# Altium footprint library ICs And Semiconductors SMD_BGA.PcbLib: 118 footprints (part 7 of 17)
Each footprint in its own frame and in the unit in brackets; x right, y up, seen from the top. Pads: shape width x height; smd on the part's side, far side on the other; paste and mask are expansions set on the pad; w line width, h text height; cw(c..) or ccw(c..) is an arc to the next point about the centre after c.
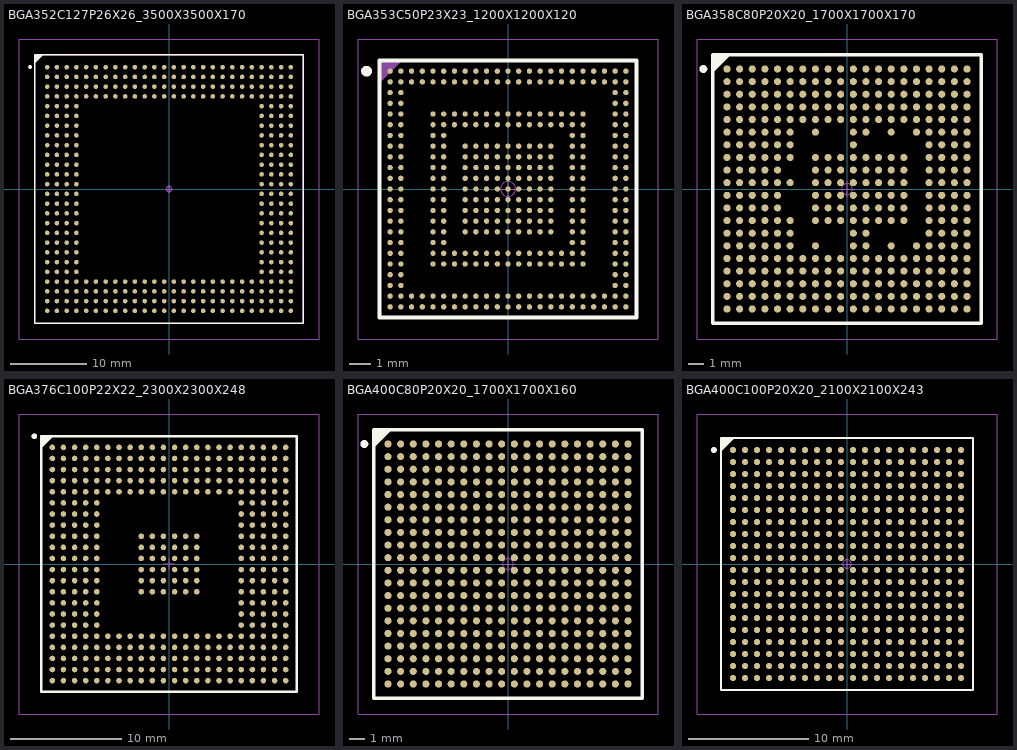
[diagram p6: the footprints below, top view; thin cyan lines are the x and y axes]

## BGA352C127P26X26_3500X3500X170 [mm] "BGA, 1.27mm Pitch, Square; 352 Pin, 26 Columns X 26 Rows, 35.00mm X 35.00mm X 1.70mm H"
height 1.7
pads (352):
  round 0.6 smd: A1(-15.875,15.875) A2(-14.605,15.875) A3(-13.335,15.875) A4(-12.065,15.875) A5(-10.795,15.875) A6(-9.525,15.875) A7(-8.255,15.875) A8(-6.985,15.875) A9(-5.715,15.875) A10(-4.445,15.875) A11(-3.175,15.875) A12(-1.905,15.875) A13(-0.635,15.875) A14(0.635,15.875) A15(1.905,15.875) A16(3.175,15.875) A17(4.445,15.875) A18(5.715,15.875) A19(6.985,15.875) A20(8.255,15.875) A21(9.525,15.875) A22(10.795,15.875) A23(12.065,15.875) A24(13.335,15.875) A25(14.605,15.875) A26(15.875,15.875) AA1(-15.875,-9.525) AA2(-14.605,-9.525) AA3(-13.335,-9.525) AA4(-12.065,-9.525) AA23(12.065,-9.525) AA24(13.335,-9.525) AA25(14.605,-9.525) AA26(15.875,-9.525) AB1(-15.875,-10.795) AB2(-14.605,-10.795) AB3(-13.335,-10.795) AB4(-12.065,-10.795) AB23(12.065,-10.795) AB24(13.335,-10.795) AB25(14.605,-10.795) AB26(15.875,-10.795) AC1(-15.875,-12.065) AC2(-14.605,-12.065) AC3(-13.335,-12.065) AC4(-12.065,-12.065) AC5(-10.795,-12.065) AC6(-9.525,-12.065) AC7(-8.255,-12.065) AC8(-6.985,-12.065) AC9(-5.715,-12.065) AC10(-4.445,-12.065) AC11(-3.175,-12.065) AC12(-1.905,-12.065) AC13(-0.635,-12.065) AC14(0.635,-12.065) AC15(1.905,-12.065) AC16(3.175,-12.065) AC17(4.445,-12.065) AC18(5.715,-12.065) AC19(6.985,-12.065) AC20(8.255,-12.065) AC21(9.525,-12.065) AC22(10.795,-12.065) AC23(12.065,-12.065) AC24(13.335,-12.065) AC25(14.605,-12.065) AC26(15.875,-12.065) AD1(-15.875,-13.335) AD2(-14.605,-13.335) AD3(-13.335,-13.335) AD4(-12.065,-13.335) AD5(-10.795,-13.335) AD6(-9.525,-13.335) AD7(-8.255,-13.335) AD8(-6.985,-13.335) AD9(-5.715,-13.335) AD10(-4.445,-13.335) AD11(-3.175,-13.335) AD12(-1.905,-13.335) AD13(-0.635,-13.335) AD14(0.635,-13.335) AD15(1.905,-13.335) AD16(3.175,-13.335) AD17(4.445,-13.335) AD18(5.715,-13.335) AD19(6.985,-13.335) AD20(8.255,-13.335) AD21(9.525,-13.335) AD22(10.795,-13.335) AD23(12.065,-13.335) AD24(13.335,-13.335) AD25(14.605,-13.335) AD26(15.875,-13.335) AE1(-15.875,-14.605) AE2(-14.605,-14.605) AE3(-13.335,-14.605) AE4(-12.065,-14.605) AE5(-10.795,-14.605) AE6(-9.525,-14.605) AE7(-8.255,-14.605) AE8(-6.985,-14.605) AE9(-5.715,-14.605) AE10(-4.445,-14.605) AE11(-3.175,-14.605) AE12(-1.905,-14.605) AE13(-0.635,-14.605) AE14(0.635,-14.605) AE15(1.905,-14.605) AE16(3.175,-14.605) AE17(4.445,-14.605) AE18(5.715,-14.605) AE19(6.985,-14.605) AE20(8.255,-14.605) AE21(9.525,-14.605) AE22(10.795,-14.605) AE23(12.065,-14.605) AE24(13.335,-14.605) AE25(14.605,-14.605) AE26(15.875,-14.605) AF1(-15.875,-15.875) AF2(-14.605,-15.875) AF3(-13.335,-15.875) AF4(-12.065,-15.875) AF5(-10.795,-15.875) AF6(-9.525,-15.875) AF7(-8.255,-15.875) AF8(-6.985,-15.875) AF9(-5.715,-15.875) AF10(-4.445,-15.875) AF11(-3.175,-15.875) AF12(-1.905,-15.875) AF13(-0.635,-15.875) AF14(0.635,-15.875) AF15(1.905,-15.875) AF16(3.175,-15.875) AF17(4.445,-15.875) AF18(5.715,-15.875) AF19(6.985,-15.875) AF20(8.255,-15.875) AF21(9.525,-15.875) AF22(10.795,-15.875) AF23(12.065,-15.875) AF24(13.335,-15.875) AF25(14.605,-15.875) AF26(15.875,-15.875) B1(-15.875,14.605) B2(-14.605,14.605) B3(-13.335,14.605) B4(-12.065,14.605) B5(-10.795,14.605) B6(-9.525,14.605) B7(-8.255,14.605) B8(-6.985,14.605) B9(-5.715,14.605) B10(-4.445,14.605) B11(-3.175,14.605) B12(-1.905,14.605) B13(-0.635,14.605) B14(0.635,14.605) B15(1.905,14.605) B16(3.175,14.605) B17(4.445,14.605) B18(5.715,14.605) B19(6.985,14.605) B20(8.255,14.605) B21(9.525,14.605) B22(10.795,14.605) B23(12.065,14.605) B24(13.335,14.605) B25(14.605,14.605) B26(15.875,14.605) C1(-15.875,13.335) C2(-14.605,13.335) C3(-13.335,13.335) C4(-12.065,13.335) C5(-10.795,13.335) C6(-9.525,13.335) C7(-8.255,13.335) C8(-6.985,13.335) C9(-5.715,13.335) C10(-4.445,13.335) C11(-3.175,13.335) C12(-1.905,13.335) C13(-0.635,13.335) C14(0.635,13.335) C15(1.905,13.335) C16(3.175,13.335) C17(4.445,13.335) C18(5.715,13.335) C19(6.985,13.335) C20(8.255,13.335) C21(9.525,13.335) C22(10.795,13.335) C23(12.065,13.335) C24(13.335,13.335) C25(14.605,13.335) C26(15.875,13.335) D1(-15.875,12.065) D2(-14.605,12.065) D3(-13.335,12.065) D4(-12.065,12.065) D5(-10.795,12.065) D6(-9.525,12.065) D7(-8.255,12.065) D8(-6.985,12.065) D9(-5.715,12.065) D10(-4.445,12.065) D11(-3.175,12.065) D12(-1.905,12.065) D13(-0.635,12.065) D14(0.635,12.065) D15(1.905,12.065) D16(3.175,12.065) D17(4.445,12.065) D18(5.715,12.065) D19(6.985,12.065) D20(8.255,12.065) D21(9.525,12.065) D22(10.795,12.065) D23(12.065,12.065) D24(13.335,12.065) D25(14.605,12.065) D26(15.875,12.065) E1(-15.875,10.795) E2(-14.605,10.795) E3(-13.335,10.795) E4(-12.065,10.795) E23(12.065,10.795) E24(13.335,10.795) E25(14.605,10.795) E26(15.875,10.795) F1(-15.875,9.525) F2(-14.605,9.525) F3(-13.335,9.525) F4(-12.065,9.525) F23(12.065,9.525) F24(13.335,9.525) F25(14.605,9.525) F26(15.875,9.525) G1(-15.875,8.255) G2(-14.605,8.255) G3(-13.335,8.255) G4(-12.065,8.255) G23(12.065,8.255) G24(13.335,8.255) G25(14.605,8.255) G26(15.875,8.255) H1(-15.875,6.985) H2(-14.605,6.985) H3(-13.335,6.985) H4(-12.065,6.985) H23(12.065,6.985) H24(13.335,6.985) H25(14.605,6.985) H26(15.875,6.985) J1(-15.875,5.715) J2(-14.605,5.715) J3(-13.335,5.715) J4(-12.065,5.715) J23(12.065,5.715) J24(13.335,5.715) J25(14.605,5.715) J26(15.875,5.715) K1(-15.875,4.445) K2(-14.605,4.445) K3(-13.335,4.445) K4(-12.065,4.445) K23(12.065,4.445) K24(13.335,4.445) K25(14.605,4.445) K26(15.875,4.445) L1(-15.875,3.175) L2(-14.605,3.175) L3(-13.335,3.175) L4(-12.065,3.175) L23(12.065,3.175) L24(13.335,3.175) L25(14.605,3.175) L26(15.875,3.175) M1(-15.875,1.905) M2(-14.605,1.905) M3(-13.335,1.905) M4(-12.065,1.905) M23(12.065,1.905) M24(13.335,1.905) M25(14.605,1.905) M26(15.875,1.905) N1(-15.875,0.635) N2(-14.605,0.635) N3(-13.335,0.635) N4(-12.065,0.635) N23(12.065,0.635) N24(13.335,0.635) N25(14.605,0.635) N26(15.875,0.635) P1(-15.875,-0.635) P2(-14.605,-0.635) P3(-13.335,-0.635) P4(-12.065,-0.635) P23(12.065,-0.635) P24(13.335,-0.635) P25(14.605,-0.635) P26(15.875,-0.635) R1(-15.875,-1.905) R2(-14.605,-1.905) R3(-13.335,-1.905) R4(-12.065,-1.905) R23(12.065,-1.905) R24(13.335,-1.905) R25(14.605,-1.905) R26(15.875,-1.905) T1(-15.875,-3.175) T2(-14.605,-3.175) T3(-13.335,-3.175) T4(-12.065,-3.175) T23(12.065,-3.175) T24(13.335,-3.175) T25(14.605,-3.175) T26(15.875,-3.175) U1(-15.875,-4.445) U2(-14.605,-4.445) U3(-13.335,-4.445) U4(-12.065,-4.445) U23(12.065,-4.445) U24(13.335,-4.445) U25(14.605,-4.445) U26(15.875,-4.445) V1(-15.875,-5.715) V2(-14.605,-5.715) V3(-13.335,-5.715) V4(-12.065,-5.715) V23(12.065,-5.715) V24(13.335,-5.715) V25(14.605,-5.715) V26(15.875,-5.715) W1(-15.875,-6.985) W2(-14.605,-6.985) W3(-13.335,-6.985) W4(-12.065,-6.985) W23(12.065,-6.985) W24(13.335,-6.985) W25(14.605,-6.985) W26(15.875,-6.985) Y1(-15.875,-8.255) Y2(-14.605,-8.255) Y3(-13.335,-8.255) Y4(-12.065,-8.255) Y23(12.065,-8.255) Y24(13.335,-8.255) Y25(14.605,-8.255) Y26(15.875,-8.255)
Top Overlay:
  circle w0.25: c-18.1,15.9 r0.125
  lines w0.2: -17.5,16.5 -16.5,17.5 ; -17.5,16.7 -16.7,17.5 ; -17.5,16.9 -16.9,17.5 ; -17.5,17.1 -17.1,17.5 ; -17.5,17.3 -17.3,17.5 ; -17.5,-17.5 17.5,-17.5 17.5,17.5 -17.5,17.5 -17.5,-17.5
Mechanical 14:
  lines w0.1: -17.5,16.5 -16.5,17.5 ; -17.5,16.6 -16.6,17.5 ; -17.5,16.7 -16.7,17.5 ; -17.5,16.8 -16.8,17.5 ; -17.5,16.9 -16.9,17.5 ; -17.5,17 -17,17.5 ; -17.5,17.1 -17.1,17.5 ; -17.5,17.2 -17.2,17.5 ; -17.5,17.3 -17.3,17.5 ; -17.5,17.4 -17.4,17.5 ; -17.5,-17.5 17.5,-17.5 17.5,17.5 -17.5,17.5 -17.5,-17.5
  text "AF" at -18.95,-16.125 h0.6
  text "AE" at -18.95,-14.855 h0.6
  text "AD" at -18.95,-13.585 h0.6
  text "AC" at -18.95,-12.315 h0.6
  text "AB" at -18.95,-11.045 h0.6
  text "AA" at -18.95,-9.775 h0.6
  text "Y" at -18.325,-8.505 h0.6
  text "W" at -18.325,-7.235 h0.6
  text "V" at -18.325,-5.965 h0.6
  text "U" at -18.325,-4.695 h0.6
  text "T" at -18.325,-3.425 h0.6
  text "R" at -18.325,-2.155 h0.6
  text "P" at -18.325,-0.885 h0.6
  text "N" at -18.325,0.385 h0.6
  text "M" at -18.325,1.655 h0.6
  text "L" at -18.325,2.925 h0.6
  text "K" at -18.325,4.195 h0.6
  text "J" at -18.325,5.465 h0.6
  text "H" at -18.325,6.735 h0.6
  text "G" at -18.325,8.005 h0.6
  text "F" at -18.325,9.275 h0.6
  text "E" at -18.325,10.545 h0.6
  text "D" at -18.325,11.815 h0.6
  text "C" at -18.325,13.085 h0.6
  text "B" at -18.325,14.355 h0.6
  text "A" at -18.325,15.625 h0.6
  text "26" at 16.05,17.925 h0.6
  text "25" at 14.825,17.925 h0.6
  text "24" at 13.5,17.925 h0.6
  text "23" at 12.275,17.925 h0.6
  text "16" at 3.5,17.9 h0.6
  text "15" at 2.175,17.875 h0.6
  text "14" at 0.85,17.875 h0.6
  text "13" at -0.375,17.875 h0.6
  text "12" at -1.675,17.875 h0.6
  text "11" at -2.975,17.875 h0.6
  text "10" at -4.2,17.875 h0.6
  text "9" at -5.425,17.875 h0.6
  text "8" at -6.7,17.875 h0.6
  text "1" at -15.65,17.925 h0.6
  text "18" at 5.975,17.9 h0.6
  text "19" at 7.275,17.9 h0.6
  text "20" at 8.525,17.9 h0.6
  text "21" at 9.775,18.025 h0.6
  text "22" at 11.025,17.925 h0.6
  text "17" at 4.725,17.9 h0.6
  text "7" at -7.97,17.875 h0.6
  text "6" at -9.24,17.875 h0.6
  text "5" at -10.51,17.875 h0.6
  text "4" at -11.78,17.875 h0.6
  text "3" at -13.05,17.875 h0.6
  text "2" at -14.32,17.875 h0.6
Mechanical 15:
  circle w0.05: c0,0 r0.35
  lines w0.05: -0.5,0 0.5,0 ; 0,-0.5 0,0.5 ; -19.55,-19.55 19.55,-19.55 19.55,19.55 -19.55,19.55 -19.55,-19.55
3D body "BGA352C127P26X26_3500X3500X170.stp": height 1.7, standoff 0, extent -17.5,-17.5 17.5,17.5

## BGA353C50P23X23_1200X1200X120 [mm] "BGA, 0.50mm Pitch, Square; 353 Pin,23 Columns X 23 Rows, 12.00mm X 12.00mm X 1.20mm H"
height 1.2
pads (353):
  round 0.25 smd: A1(-5.5,5.5) A2(-5,5.5) A3(-4.5,5.5) A4(-4,5.5) A5(-3.5,5.5) A6(-3,5.5) A7(-2.5,5.5) A8(-2,5.5) A9(-1.5,5.5) A10(-1,5.5) A11(-0.5,5.5) A12(0,5.5) A13(0.5,5.5) A14(1,5.5) A15(1.5,5.5) A16(2,5.5) A17(2.5,5.5) A18(3,5.5) A19(3.5,5.5) A20(4,5.5) A21(4.5,5.5) A22(5,5.5) A23(5.5,5.5) AA1(-5.5,-4.5) AA2(-5,-4.5) AA22(5,-4.5) AA23(5.5,-4.5) AB1(-5.5,-5) AB2(-5,-5) AB3(-4.5,-5) AB4(-4,-5) AB5(-3.5,-5) AB6(-3,-5) AB7(-2.5,-5) AB8(-2,-5) AB9(-1.5,-5) AB10(-1,-5) AB11(-0.5,-5) AB12(0,-5) AB13(0.5,-5) AB14(1,-5) AB15(1.5,-5) AB16(2,-5) AB17(2.5,-5) AB18(3,-5) AB19(3.5,-5) AB20(4,-5) AB21(4.5,-5) AB22(5,-5) AB23(5.5,-5) AC1(-5.5,-5.5) AC2(-5,-5.5) AC3(-4.5,-5.5) AC4(-4,-5.5) AC5(-3.5,-5.5) AC6(-3,-5.5) AC7(-2.5,-5.5) AC8(-2,-5.5) AC9(-1.5,-5.5) AC10(-1,-5.5) AC11(-0.5,-5.5) AC12(0,-5.5) AC13(0.5,-5.5) AC14(1,-5.5) AC15(1.5,-5.5) AC16(2,-5.5) AC17(2.5,-5.5) AC18(3,-5.5) AC19(3.5,-5.5) AC20(4,-5.5) AC21(4.5,-5.5) AC22(5,-5.5) AC23(5.5,-5.5) B1(-5.5,5) B2(-5,5) B3(-4.5,5) B4(-4,5) B5(-3.5,5) B6(-3,5) B7(-2.5,5) B8(-2,5) B9(-1.5,5) B10(-1,5) B11(-0.5,5) B12(0,5) B13(0.5,5) B14(1,5) B15(1.5,5) B16(2,5) B17(2.5,5) B18(3,5) B19(3.5,5) B20(4,5) B21(4.5,5) B22(5,5) B23(5.5,5) C1(-5.5,4.5) C2(-5,4.5) C22(5,4.5) C23(5.5,4.5) D1(-5.5,4) D2(-5,4) D22(5,4) D23(5.5,4) E1(-5.5,3.5) E2(-5,3.5) E5(-3.5,3.5) E6(-3,3.5) E7(-2.5,3.5) E8(-2,3.5) E9(-1.5,3.5) E10(-1,3.5) E11(-0.5,3.5) E12(0,3.5) E13(0.5,3.5) E14(1,3.5) E15(1.5,3.5) E16(2,3.5) E17(2.5,3.5) E18(3,3.5) E19(3.5,3.5) E22(5,3.5) E23(5.5,3.5) F1(-5.5,3) F2(-5,3) F5(-3.5,3) F6(-3,3) F7(-2.5,3) F8(-2,3) F9(-1.5,3) F10(-1,3) F11(-0.5,3) F12(0,3) F13(0.5,3) F14(1,3) F15(1.5,3) F16(2,3) F17(2.5,3) F18(3,3) F19(3.5,3) F22(5,3) F23(5.5,3) G1(-5.5,2.5) G2(-5,2.5) G5(-3.5,2.5) G6(-3,2.5) G18(3,2.5) G19(3.5,2.5) G22(5,2.5) G23(5.5,2.5) H1(-5.5,2) H2(-5,2) H5(-3.5,2) H6(-3,2) H8(-2,2) H9(-1.5,2) H10(-1,2) H11(-0.5,2) H12(0,2) H13(0.5,2) H14(1,2) H15(1.5,2) H16(2,2) H18(3,2) H19(3.5,2) H22(5,2) H23(5.5,2) J1(-5.5,1.5) J2(-5,1.5) J5(-3.5,1.5) J6(-3,1.5) J8(-2,1.5) J9(-1.5,1.5) J10(-1,1.5) J11(-0.5,1.5) J12(0,1.5) J13(0.5,1.5) J14(1,1.5) J15(1.5,1.5) J16(2,1.5) J18(3,1.5) J19(3.5,1.5) J22(5,1.5) J23(5.5,1.5) K1(-5.5,1) K2(-5,1) K5(-3.5,1) K6(-3,1) K8(-2,1) K9(-1.5,1) K10(-1,1) K11(-0.5,1) K12(0,1) K13(0.5,1) K14(1,1) K15(1.5,1) K16(2,1) K18(3,1) K19(3.5,1) K22(5,1) K23(5.5,1) L1(-5.5,0.5) L2(-5,0.5) L5(-3.5,0.5) L6(-3,0.5) L8(-2,0.5) L9(-1.5,0.5) L10(-1,0.5) L11(-0.5,0.5) L12(0,0.5) L13(0.5,0.5) L14(1,0.5) L15(1.5,0.5) L16(2,0.5) L18(3,0.5) L19(3.5,0.5) L22(5,0.5) L23(5.5,0.5) M1(-5.5,0) M2(-5,0) M5(-3.5,0) M6(-3,0) M8(-2,0) M9(-1.5,0) M10(-1,0) M11(-0.5,0) M12(0,0) M13(0.5,0) M14(1,0) M15(1.5,0) M16(2,0) M18(3,0) M19(3.5,0) M22(5,0) M23(5.5,0) N1(-5.5,-0.5) N2(-5,-0.5) N5(-3.5,-0.5) N6(-3,-0.5) N8(-2,-0.5) N9(-1.5,-0.5) N10(-1,-0.5) N11(-0.5,-0.5) N12(0,-0.5) N13(0.5,-0.5) N14(1,-0.5) N15(1.5,-0.5) N16(2,-0.5) N18(3,-0.5) N19(3.5,-0.5) N22(5,-0.5) N23(5.5,-0.5) P1(-5.5,-1) P2(-5,-1) P5(-3.5,-1) P6(-3,-1) P8(-2,-1) P9(-1.5,-1) P10(-1,-1) P11(-0.5,-1) P12(0,-1) P13(0.5,-1) P14(1,-1) P15(1.5,-1) P16(2,-1) P18(3,-1) P19(3.5,-1) P22(5,-1) P23(5.5,-1) R1(-5.5,-1.5) R2(-5,-1.5) R5(-3.5,-1.5) R6(-3,-1.5) R8(-2,-1.5) R9(-1.5,-1.5) R10(-1,-1.5) R11(-0.5,-1.5) R12(0,-1.5) R13(0.5,-1.5) R14(1,-1.5) R15(1.5,-1.5) R16(2,-1.5) R18(3,-1.5) R19(3.5,-1.5) R22(5,-1.5) R23(5.5,-1.5) T1(-5.5,-2) T2(-5,-2) T5(-3.5,-2) T6(-3,-2) T8(-2,-2) T9(-1.5,-2) T10(-1,-2) T11(-0.5,-2) T12(0,-2) T13(0.5,-2) T14(1,-2) T15(1.5,-2) T16(2,-2) T18(3,-2) T19(3.5,-2) T22(5,-2) T23(5.5,-2) U1(-5.5,-2.5) U2(-5,-2.5) U5(-3.5,-2.5) U6(-3,-2.5) U18(3,-2.5) U19(3.5,-2.5) U22(5,-2.5) U23(5.5,-2.5) V1(-5.5,-3) V2(-5,-3) V5(-3.5,-3) V6(-3,-3) V7(-2.5,-3) V8(-2,-3) V9(-1.5,-3) V10(-1,-3) V11(-0.5,-3) V12(0,-3) V13(0.5,-3) V14(1,-3) V15(1.5,-3) V16(2,-3) V17(2.5,-3) V18(3,-3) V19(3.5,-3) V22(5,-3) V23(5.5,-3) W1(-5.5,-3.5) W2(-5,-3.5) W5(-3.5,-3.5) W6(-3,-3.5) W7(-2.5,-3.5) W8(-2,-3.5) W9(-1.5,-3.5) W10(-1,-3.5) W11(-0.5,-3.5) W12(0,-3.5) W13(0.5,-3.5) W14(1,-3.5) W15(1.5,-3.5) W16(2,-3.5) W17(2.5,-3.5) W18(3,-3.5) W19(3.5,-3.5) W22(5,-3.5) W23(5.5,-3.5) Y1(-5.5,-4) Y2(-5,-4) Y22(5,-4) Y23(5.5,-4)
Top Overlay:
  circle w0.25: c-6.6,5.5 r0.125
  lines w0.2: -6,-6 6,-6 6,6 -6,6 -6,-6
Mechanical 14:
  lines w0.1: -6,5 -5,6 ; -6,5.1 -5.1,6 ; -6,5.2 -5.2,6 ; -6,5.3 -5.3,6 ; -6,5.4 -5.4,6 ; -6,5.5 -5.5,6 ; -6,5.6 -5.6,6 ; -6,5.7 -5.7,6 ; -6,5.8 -5.8,6 ; -6,5.9 -5.9,6 ; -6,-6 6,-6 6,6 -6,6 -6,-6
  text "1" at -5.4,6.4 h0.6
  text "23" at 5.8,6.4 h0.6
  text "AC" at -7.4,-6 h0.6
  text "A" at -6.7,5.4 h0.6
Mechanical 15:
  circle w0.05: c0,0 r0.35
  lines w0.05: -0.5,0 0.5,0 ; 0,-0.5 0,0.5 ; -7,-7 7,-7 7,7 -7,7 -7,-7
3D body "BGA353C50P23X23_1200X1200X120.stp": height 1.2, standoff 0, extent -6,-6 6,6

## BGA358C80P20X20_1700X1700X170 [mm] "BGA, 0.80mm Pitch, Square; 358 Pin, 20 Columns X 20 Rows, 17.00mm X 17.00mm X 1.70mm H"
height 1.7
pads (358):
  round 0.45 smd: A1(-7.6,7.6) A2(-6.8,7.6) A3(-6,7.6) A4(-5.2,7.6) A5(-4.4,7.6) A6(-3.6,7.6) A7(-2.8,7.6) A8(-2,7.6) A9(-1.2,7.6) A10(-0.4,7.6) A11(0.4,7.6) A12(1.2,7.6) A13(2,7.6) A14(2.8,7.6) A15(3.6,7.6) A16(4.4,7.6) A17(5.2,7.6) A18(6,7.6) A19(6.8,7.6) A20(7.6,7.6) B1(-7.6,6.8) B2(-6.8,6.8) B3(-6,6.8) B4(-5.2,6.8) B5(-4.4,6.8) B6(-3.6,6.8) B7(-2.8,6.8) B8(-2,6.8) B9(-1.2,6.8) B10(-0.4,6.8) B11(0.4,6.8) B12(1.2,6.8) B13(2,6.8) B14(2.8,6.8) B15(3.6,6.8) B16(4.4,6.8) B17(5.2,6.8) B18(6,6.8) B19(6.8,6.8) B20(7.6,6.8) C1(-7.6,6) C2(-6.8,6) C3(-6,6) C4(-5.2,6) C5(-4.4,6) C6(-3.6,6) C7(-2.8,6) C8(-2,6) C9(-1.2,6) C10(-0.4,6) C11(0.4,6) C12(1.2,6) C13(2,6) C14(2.8,6) C15(3.6,6) C16(4.4,6) C17(5.2,6) C18(6,6) C19(6.8,6) C20(7.6,6) D1(-7.6,5.2) D2(-6.8,5.2) D3(-6,5.2) D4(-5.2,5.2) D5(-4.4,5.2) D6(-3.6,5.2) D7(-2.8,5.2) D8(-2,5.2) D9(-1.2,5.2) D10(-0.4,5.2) D11(0.4,5.2) D12(1.2,5.2) D13(2,5.2) D14(2.8,5.2) D15(3.6,5.2) D16(4.4,5.2) D17(5.2,5.2) D18(6,5.2) D19(6.8,5.2) D20(7.6,5.2) E1(-7.6,4.4) E2(-6.8,4.4) E3(-6,4.4) E4(-5.2,4.4) E5(-4.4,4.4) E6(-3.6,4.4) E7(-2.8,4.4) E8(-2,4.4) E9(-1.2,4.4) E10(-0.4,4.4) E11(0.4,4.4) E12(1.2,4.4) E13(2,4.4) E14(2.8,4.4) E15(3.6,4.4) E16(4.4,4.4) E17(5.2,4.4) E18(6,4.4) E19(6.8,4.4) E20(7.6,4.4) F1(-7.6,3.6) F2(-6.8,3.6) F3(-6,3.6) F4(-5.2,3.6) F5(-4.4,3.6) F6(-3.6,3.6) F8(-2,3.6) F11(0.4,3.6) F12(1.2,3.6) F14(2.8,3.6) F16(4.4,3.6) F17(5.2,3.6) F18(6,3.6) F19(6.8,3.6) F20(7.6,3.6) G1(-7.6,2.8) G2(-6.8,2.8) G3(-6,2.8) G4(-5.2,2.8) G5(-4.4,2.8) G6(-3.6,2.8) G11(0.4,2.8) G17(5.2,2.8) G18(6,2.8) G19(6.8,2.8) G20(7.6,2.8) H1(-7.6,2) H2(-6.8,2) H3(-6,2) H4(-5.2,2) H5(-4.4,2) H6(-3.6,2) H8(-2,2) H9(-1.2,2) H10(-0.4,2) H11(0.4,2) H12(1.2,2) H13(2,2) H14(2.8,2) H15(3.6,2) H17(5.2,2) H18(6,2) H19(6.8,2) H20(7.6,2) J1(-7.6,1.2) J2(-6.8,1.2) J3(-6,1.2) J4(-5.2,1.2) J5(-4.4,1.2) J8(-2,1.2) J9(-1.2,1.2) J10(-0.4,1.2) J11(0.4,1.2) J12(1.2,1.2) J13(2,1.2) J14(2.8,1.2) J15(3.6,1.2) J17(5.2,1.2) J18(6,1.2) J19(6.8,1.2) J20(7.6,1.2) K1(-7.6,0.4) K2(-6.8,0.4) K3(-6,0.4) K4(-5.2,0.4) K5(-4.4,0.4) K6(-3.6,0.4) K8(-2,0.4) K9(-1.2,0.4) K10(-0.4,0.4) K11(0.4,0.4) K12(1.2,0.4) K13(2,0.4) K14(2.8,0.4) K15(3.6,0.4) K17(5.2,0.4) K18(6,0.4) K19(6.8,0.4) K20(7.6,0.4) L1(-7.6,-0.4) L2(-6.8,-0.4) L3(-6,-0.4) L4(-5.2,-0.4) L5(-4.4,-0.4) L8(-2,-0.4) L9(-1.2,-0.4) L10(-0.4,-0.4) L11(0.4,-0.4) L12(1.2,-0.4) L13(2,-0.4) L14(2.8,-0.4) L15(3.6,-0.4) L17(5.2,-0.4) L18(6,-0.4) L19(6.8,-0.4) L20(7.6,-0.4) M1(-7.6,-1.2) M2(-6.8,-1.2) M3(-6,-1.2) M4(-5.2,-1.2) M5(-4.4,-1.2) M8(-2,-1.2) M9(-1.2,-1.2) M10(-0.4,-1.2) M11(0.4,-1.2) M12(1.2,-1.2) M13(2,-1.2) M14(2.8,-1.2) M15(3.6,-1.2) M17(5.2,-1.2) M18(6,-1.2) M19(6.8,-1.2) M20(7.6,-1.2) N1(-7.6,-2) N2(-6.8,-2) N3(-6,-2) N4(-5.2,-2) N5(-4.4,-2) N6(-3.6,-2) N8(-2,-2) N9(-1.2,-2) N10(-0.4,-2) N11(0.4,-2) N12(1.2,-2) N13(2,-2) N14(2.8,-2) N15(3.6,-2) N17(5.2,-2) N18(6,-2) N19(6.8,-2) N20(7.6,-2) P1(-7.6,-2.8) P2(-6.8,-2.8) P3(-6,-2.8) P4(-5.2,-2.8) P5(-4.4,-2.8) P6(-3.6,-2.8) P11(0.4,-2.8) P12(1.2,-2.8) P17(5.2,-2.8) P18(6,-2.8) P19(6.8,-2.8) P20(7.6,-2.8) R1(-7.6,-3.6) R2(-6.8,-3.6) R3(-6,-3.6) R4(-5.2,-3.6) R5(-4.4,-3.6) R6(-3.6,-3.6) R8(-2,-3.6) R11(0.4,-3.6) R12(1.2,-3.6) R14(2.8,-3.6) R16(4.4,-3.6) R17(5.2,-3.6) R18(6,-3.6) R19(6.8,-3.6) R20(7.6,-3.6) T1(-7.6,-4.4) T2(-6.8,-4.4) T3(-6,-4.4) T4(-5.2,-4.4) T5(-4.4,-4.4) T6(-3.6,-4.4) T7(-2.8,-4.4) T8(-2,-4.4) T9(-1.2,-4.4) T10(-0.4,-4.4) T11(0.4,-4.4) T12(1.2,-4.4) T13(2,-4.4) T14(2.8,-4.4) T15(3.6,-4.4) T16(4.4,-4.4) T17(5.2,-4.4) T18(6,-4.4) T19(6.8,-4.4) T20(7.6,-4.4) U1(-7.6,-5.2) U2(-6.8,-5.2) U3(-6,-5.2) U4(-5.2,-5.2) U5(-4.4,-5.2) U6(-3.6,-5.2) U7(-2.8,-5.2) U8(-2,-5.2) U9(-1.2,-5.2) U10(-0.4,-5.2) U11(0.4,-5.2) U12(1.2,-5.2) U13(2,-5.2) U14(2.8,-5.2) U15(3.6,-5.2) U16(4.4,-5.2) U17(5.2,-5.2) U18(6,-5.2) U19(6.8,-5.2) U20(7.6,-5.2) V1(-7.6,-6) V2(-6.8,-6) V3(-6,-6) V4(-5.2,-6) V5(-4.4,-6) V6(-3.6,-6) V7(-2.8,-6) V8(-2,-6) V9(-1.2,-6) V10(-0.4,-6) V11(0.4,-6) V12(1.2,-6) V13(2,-6) V14(2.8,-6) V15(3.6,-6) V16(4.4,-6) V17(5.2,-6) V18(6,-6) V19(6.8,-6) V20(7.6,-6) W1(-7.6,-6.8) W2(-6.8,-6.8) W3(-6,-6.8) W4(-5.2,-6.8) W5(-4.4,-6.8) W6(-3.6,-6.8) W7(-2.8,-6.8) W8(-2,-6.8) W9(-1.2,-6.8) W10(-0.4,-6.8) W11(0.4,-6.8) W12(1.2,-6.8) W13(2,-6.8) W14(2.8,-6.8) W15(3.6,-6.8) W16(4.4,-6.8) W17(5.2,-6.8) W18(6,-6.8) W19(6.8,-6.8) W20(7.6,-6.8) Y1(-7.6,-7.6) Y2(-6.8,-7.6) Y3(-6,-7.6) Y4(-5.2,-7.6) Y5(-4.4,-7.6) Y6(-3.6,-7.6) Y7(-2.8,-7.6) Y8(-2,-7.6) Y9(-1.2,-7.6) Y10(-0.4,-7.6) Y11(0.4,-7.6) Y12(1.2,-7.6) Y13(2,-7.6) Y14(2.8,-7.6) Y15(3.6,-7.6) Y16(4.4,-7.6) Y17(5.2,-7.6) Y18(6,-7.6) Y19(6.8,-7.6) Y20(7.6,-7.6)
Top Overlay:
  circle w0.25: c-9.1,7.6 r0.125
  lines w0.2: -8.5,7.5 -7.5,8.5 ; -8.5,7.7 -7.7,8.5 ; -8.5,7.9 -7.9,8.5 ; -8.5,8.1 -8.1,8.5 ; -8.5,8.3 -8.3,8.5 ; -8.5,-8.5 -8.5,8.5 8.5,8.5 8.5,-8.5 -8.5,-8.5
Mechanical 14:
  lines w0.1: -8.5,7.5 -7.5,8.5 ; -8.5,7.6 -7.6,8.5 ; -8.5,7.7 -7.7,8.5 ; -8.5,7.8 -7.8,8.5 ; -8.5,7.9 -7.9,8.5 ; -8.5,8 -8,8.5 ; -8.5,8.1 -8.1,8.5 ; -8.5,8.2 -8.2,8.5 ; -8.5,8.3 -8.3,8.5 ; -8.5,8.4 -8.4,8.5 ; -8.5,-8.5 -8.5,8.5 8.5,8.5 8.5,-8.5 -8.5,-8.5
  text "Y" at -9.4,-7.9 h0.6
  text "W" at -9.4,-7.1 h0.6
  text "V" at -9.4,-6.3 h0.6
  text "U" at -9.4,-5.5 h0.6
  text "T" at -9.4,-4.7 h0.6
  text "R" at -9.4,-3.9 h0.6
  text "P" at -9.4,-3.1 h0.6
  text "N" at -9.4,-2.3 h0.6
  text "M" at -9.4,-1.5 h0.6
  text "L" at -9.4,-0.7 h0.6
  text "K" at -9.4,0.1 h0.6
  text "J" at -9.4,0.9 h0.6
  text "H" at -9.4,1.7 h0.6
  text "G" at -9.4,2.5 h0.6